# Altium schematic symbol library FPGA_Xilinx_Virtex7.SchLib: 34 symbols (part 7 of 26) (continued)
## XC7VH870T-FLG1932 (continued)
part P pins: AB22 VREFN_0, AB23 VP_0, AC22 VN_0, AC23 VREFP_0, AD22 DXN_0, AD23 DXP_0, AJ26 DONE_0, AK19 INIT_B_0, AL26 PROGRAM_B_0, AM19 M2_0, AM21 M1_0, AM23 M0_0, N20 TMS_0, N22 TCK_0, N26 TDO_0, R20 TDI_0, R26 CCLK_0, V17 VCCO_0, W16 VCCO_0
part Q pins: A3 GND, A4 GND, A7 GND, A38 GND, A41 GND, A42 GND, AA17 VCCINT, AA19 VCCAUX_IO_G2, AA21 VCCINT, AA22 GNDADC, AA23 VCCADC, AA25 VCCAUX_IO_G0, AA27 VCCINT, AA29 VCCINT, AB16 VCCINT, AB18 VCCAUX, AB20 VCCINT, AB24 VCCBRAM, AB26 VCCAUX, AB28 VCCINT, AC17 VCCINT, AC19 VCCAUX_IO_G2, AC21 VCCINT, AC25 VCCAUX_IO_G0, AC27 VCCINT, AC29 VCCINT, AD16 VCCINT, AD18 VCCAUX, AD20 VCCINT, AD24 VCCBRAM, AD26 VCCAUX, AD28 VCCINT, AE17 VCCINT, AE19 VCCINT, AE21 VCCINT, AE23 VCCINT, AE25 VCCINT, AE27 VCCINT, AE29 VCCINT, AF16 VCCINT, AF18 VCCAUX, AF20 VCCINT, AF22 VCCINT, AF24 VCCBRAM, AF26 VCCAUX, AF28 VCCINT, AG17 VCCINT, AG19 VCCINT, AG21 VCCINT, AG23 VCCINT, AG25 VCCINT, AG27 VCCINT, AG29 VCCINT, AH16 VCCINT, AH18 VCCAUX, AH20 VCCINT, AH22 VCCINT, AH24 VCCBRAM, AH26 VCCAUX, AH28 VCCINT, AJ17 VCCINT, AJ19 VCCINT, AJ21 VCCINT, AJ23 VCCINT, AJ25 VCCINT, AJ27 VCCINT, AK18 VCCINT, AK20 VCCINT, AK22 VCCINT, AK24 VCCBRAM, AK26 VCCINT, AL19 VCCINT, AL21 VCCINT, AL23 VCCINT, AL25 VCCINT, AL27 VCCINT, AM18 VCCINT, AM20 VCCINT, AM22 VCCINT, AM24 VCCBRAM, AM26 VCCINT, B2 GND, B5 GND, B7 GND, B38 GND, B40 GND, B43 GND, C4 GND, C7 GND, C38 GND, C41 GND, D1 GND, D6 GND, D7 GND, D38 GND, D39 GND, D44 GND, E3 GND, E4 GND, E7 GND, E8 GND, E9 GND, E10 GND, E11 GND, E12 GND, E13 GND, E14 GND, E15 GND, E16 GND, E17 GND, E19 GND, E22 GND, E23 GND, E26 GND, E27 GND, E28 GND, E29 GND, E30 GND, E31 GND, E32 GND, E33 GND, E34 GND, E35 GND, E36 GND, E37 GND, E38 GND, E41 GND, E42 GND, F1 GND, F2 GND, F6 GND, F9 GND, F17 GND, F19 GND, F21 GND, F23 GND, F25 GND, F27 GND, F28 GND, F36 GND, F39 GND, F43 GND, F44 GND, G4 GND, G7 GND, G8 GND, G9 GND, G14 GND, G17 GND, G19 GND, G22 GND, G23 GND, G24 GND, G25 GND, G28 GND, G34 GND, G36 GND, G37 GND, G38 GND, G41 GND, H1 GND, H6 GND, H9 GND, H11 GND, H17 GND, H18 GND, H19 GND, H20 GND, H21 GND, H23 GND, H24 GND, H25 GND, H27 GND, H28 GND, H31 GND, N19 VCCINT, N21 VCCINT, N23 VCCINT, N25 VCCINT, N27 VCCINT, P20 VCCINT, P22 VCCINT, P24 VCCBRAM, P26 VCCINT, R19 VCCINT, R21 VCCINT, R22 VCCBATT_0, R23 VCCINT, R25 VCCINT, R27 VCCINT, T18 VCCINT, T20 VCCINT, T22 VCCINT, T24 VCCBRAM, T26 VCCINT, T28 VCCINT, U17 VCCINT, U19 VCCINT, U21 VCCINT, U23 VCCINT, U25 VCCINT, U27 VCCINT, U29 VCCINT, V16 VCCINT, V18 VCCAUX, V20 VCCINT, V22 VCCINT, V24 VCCBRAM, V26 VCCAUX, V28 VCCINT, W17 VCCINT, W19 VCCAUX_IO_G2, W21 VCCINT, W23 VCCINT, W25 VCCAUX_IO_G0, W27 VCCINT, W29 VCCINT, Y16 VCCINT, Y18 VCCAUX, Y20 VCCINT, Y22 VCCINT, Y24 VCCBRAM, Y26 VCCAUX, Y28 VCCINT
part R pins: AA3 GND, AA4 GND, AA7 GND, AA11 GND, AA12 GND, AA16 GND, AA18 GND, AA20 GND, AA24 GND, AA26 GND, AA28 GND, AA32 GND, AA34 GND, AA38 GND, AA41 GND, AA42 GND, AB1 GND, AB2 GND, AB5 GND, AB9 GND, AB10 GND, AB11 GND, AB17 GND, AB19 GND, AB21 GND, AB25 GND, AB27 GND, AB29 GND, AB34 GND, AB35 GND, AB36 GND, AB40 GND, AB43 GND, AB44 GND, AC3 GND, AC7 GND, AC8 GND, AC11 GND, AC16 GND, AC18 GND, AC20 GND, AC24 GND, AC26 GND, AC28 GND, AC34 GND, AC37 GND, AC38 GND, AC42 GND, AD1 GND, AD5 GND, AD6 GND, AD9 GND, AD11 GND, AD13 GND, AD17 GND, AD19 GND, AD21 GND, AD25 GND, AD27 GND, AD29 GND, AD33 GND, AD34 GND, AD36 GND, AD39 GND, AD40 GND, AD44 GND, AE3 GND, AE4 GND, AE7 GND, AE11 GND, AE16 GND, AE18 GND, AE20 GND, AE22 GND, AE24 GND, AE26 GND, AE28 GND, AE30 GND, AE34 GND, AE38 GND, AE41 GND, AE42 GND, AF1 GND, AF2 GND, AF5 GND, AF9 GND, AF10 GND, AF11 GND, AF17 GND, AF19 GND, AF21 GND, AF23 GND, AF25 GND, AF27 GND, AF29 GND, AF34 GND, AF35 GND, AF36 GND, AF40 GND, AF43 GND, AF44 GND, AG3 GND, AG7 GND, H36 GND, H39 GND, H44 GND, J3 GND, J4 GND, J7 GND, J9 GND, J17 GND, J18 GND, J20 GND, J24 GND, J26 GND, J28 GND, J36 GND, J38 GND, J41 GND, J42 GND, K1 GND, K2 GND, K5 GND, K9 GND, K10 GND, K11 GND, K15 GND, K17 GND, K18 GND, K21 GND, K22 GND, K23 GND, K24 GND, K25 GND, K26 GND, K27 GND, K28 GND, K34 GND, K35 GND, K36 GND, K40 GND, K43 GND, K44 GND, L3 GND, L7 GND, L8 GND, L11 GND, L12 GND, L18 GND, L19 GND, L21 GND, L23 GND, L25 GND, L27 GND, L32 GND, L34 GND, L37 GND, L38 GND, L42 GND, M1 GND, M5 GND, M6 GND, M9 GND, M10 GND, M11 GND, M19 GND, M20 GND, M21 GND, M22 GND, M23 GND, M24 GND, M25 GND, M26 GND, M27 GND, M29 GND, M34 GND, M35 GND, M36 GND, M39 GND, M40 GND, M44 GND, N3 GND, N4 GND, N7 GND, N11 GND, N16 GND, N24 GND, N34 GND, N38 GND, N41 GND, N42 GND, P1 GND, P2 GND, P5 GND, P9 GND, P10 GND, P11 GND, P13 GND, P19 GND, P21 GND, P23 GND, P25 GND, P27 GND, P33 GND, P34 GND, P35 GND, P36 GND, P40 GND, P43 GND, P44 GND, R3 GND, R7 GND, R8 GND, R11 GND, R18 GND, R24 GND, R30 GND, R34 GND, R37 GND, R38 GND, R42 GND, T1 GND, T5 GND, T6 GND, T9 GND, T11 GND, T17 GND, T19 GND, T21 GND, T23 GND, T25 GND, T27 GND, T34 GND, T36 GND, T39 GND, T40 GND, T44 GND, U3 GND, U7 GND, U11 GND, U14 GND, U16 GND, U18 GND, U20 GND, U22 GND, U24 GND, U26 GND, U28 GND, U34 GND, U38 GND, U42 GND, V1 GND, V5 GND, V9 GND, V10 GND, V11 GND, V19 GND, V21 GND, V23 GND, V25 GND, V27 GND, V29 GND, V31 GND, V34 GND, V35 GND, V36 GND, V40 GND, V44 GND, W3 GND, W7 GND, W8 GND, W11 GND, W18 GND, W20 GND, W22 GND, W24 GND, W26 GND, W28 GND, W34 GND, W37 GND, W38 GND, W42 GND, Y1 GND, Y5 GND, Y6 GND, Y9 GND, Y10 GND, Y11 GND, Y15 GND, Y17 GND, Y19 GND, Y21 GND, Y23 GND, Y25 GND, Y27 GND, Y29 GND, Y34 GND, Y35 GND, Y36 GND, Y39 GND, Y40 GND, Y44 GND
part S pins: AG11 GND, AG14 GND, AG16 GND, AG18 GND, AG20 GND, AG22 GND, AG24 GND, AG26 GND, AG28 GND, AG34 GND, AG38 GND, AG42 GND, AH1 GND, AH5 GND, AH9 GND, AH10 GND, AH11 GND, AH17 GND, AH19 GND, AH21 GND, AH23 GND, AH25 GND, AH27 GND, AH29 GND, AH31 GND, AH34 GND, AH35 GND, AH36 GND, AH40 GND, AH44 GND, AJ3 GND, AJ4 GND, AJ7 GND, AJ11 GND, AJ16 GND, AJ18 GND, AJ20 GND, AJ22 GND, AJ24 GND, AJ28 GND, AJ34 GND, AJ38 GND, AJ41 GND, AJ42 GND, AK1 GND, AK5 GND, AK9 GND, AK11 GND, AK15 GND, AK17 GND, AK21 GND, AK23 GND, AK25 GND, AK27 GND, AK34 GND, AK36 GND, AK40 GND, AK44 GND, AL3 GND, AL7 GND, AL8 GND, AL11 GND, AL12 GND, AL18 GND, AL20 GND, AL22 GND, AL24 GND, AL32 GND, AL34 GND, AL37 GND, AL38 GND, AL42 GND, AM1 GND, AM5 GND, AM6 GND, AM9 GND, AM10 GND, AM11 GND, AM25 GND, AM27 GND, AM29 GND, AM34 GND, AM35 GND, AM36 GND, AM39 GND, AM40 GND, AM44 GND, AN3 GND, AN4 GND, AN8 GND, AN11 GND, AN16 GND, AN18 GND, AN19 GND, AN20 GND, AN21 GND, AN22 GND, AN23 GND, AN24 GND, AN25 GND, AN26 GND, AN27 GND, AN34 GND, AN37 GND, AN41 GND, AN42 GND, AP1 GND, AP2 GND, AP5 GND, AP6 GND, AP9 GND, AP10 GND, AP11 GND, AP13 GND, AP18 GND, AP20 GND, AP22 GND, AP24 GND, AP26 GND, AP27 GND, AP33 GND, AP34 GND, AP35 GND, AP36 GND, AP39 GND, AP40 GND, AP43 GND, AP44 GND, AR4 GND, AR7 GND, AR9 GND, AR10 GND, AR17 GND, AR18 GND, AR19 GND, AR20 GND, AR21 GND, AR22 GND, AR23 GND, AR24 GND, AR27 GND, AR28 GND, AR30 GND, AR36 GND, AR38 GND, AR41 GND, AT1 GND, AT6 GND, AT9 GND, AT17 GND, AT19 GND, AT21 GND, AT25 GND, AT27 GND, AT28 GND, AT36 GND, AT39 GND, AT44 GND, AU3 GND, AU4 GND, AU7 GND, AU8 GND, AU9 GND, AU14 GND, AU17 GND, AU18 GND, AU20 GND, AU21 GND, AU22 GND, AU24 GND, AU25 GND, AU26 GND, AU27 GND, AU28 GND, AU34 GND, AU36 GND, AU37 GND, AU38 GND, AU41 GND, AU42 GND, AV1 GND, AV2 GND, AV6 GND, AV9 GND, AV11 GND, AV17 GND, AV20 GND, AV21 GND, AV22 GND, AV23 GND, AV26 GND, AV28 GND, AV31 GND, AV36 GND, AV39 GND, AV43 GND, AV44 GND, AW4 GND, AW7 GND, AW8 GND, AW9 GND, AW17 GND, AW18 GND, AW20 GND, AW22 GND, AW24 GND, AW26 GND, AW28 GND, AW36 GND, AW37 GND, AW38 GND, AW41 GND, AY1 GND, AY6 GND, AY7 GND, AY8 GND, AY9 GND, AY10 GND, AY11 GND, AY12 GND, AY13 GND, AY14 GND, AY15 GND, AY16 GND, AY17 GND, AY18 GND, AY19 GND, AY22 GND, AY23 GND, AY26 GND, AY28 GND, AY29 GND, AY30 GND, AY31 GND, AY32 GND, AY33 GND, AY34 GND, AY35 GND, AY36 GND, AY37 GND, AY38 GND, AY39 GND, AY44 GND, BA3 GND, BA4 GND, BA7 GND, BA38 GND, BA41 GND, BA42 GND, BB1 GND, BB2 GND, BB5 GND, BB7 GND, BB38 GND, BB40 GND, BB43 GND, BB44 GND, BC2 GND, BC4 GND, BC7 GND, BC38 GND, BC41 GND, BC43 GND, BD5 GND, BD6 GND, BD7 GND, BD38 GND, BD39 GND, BD40 GND

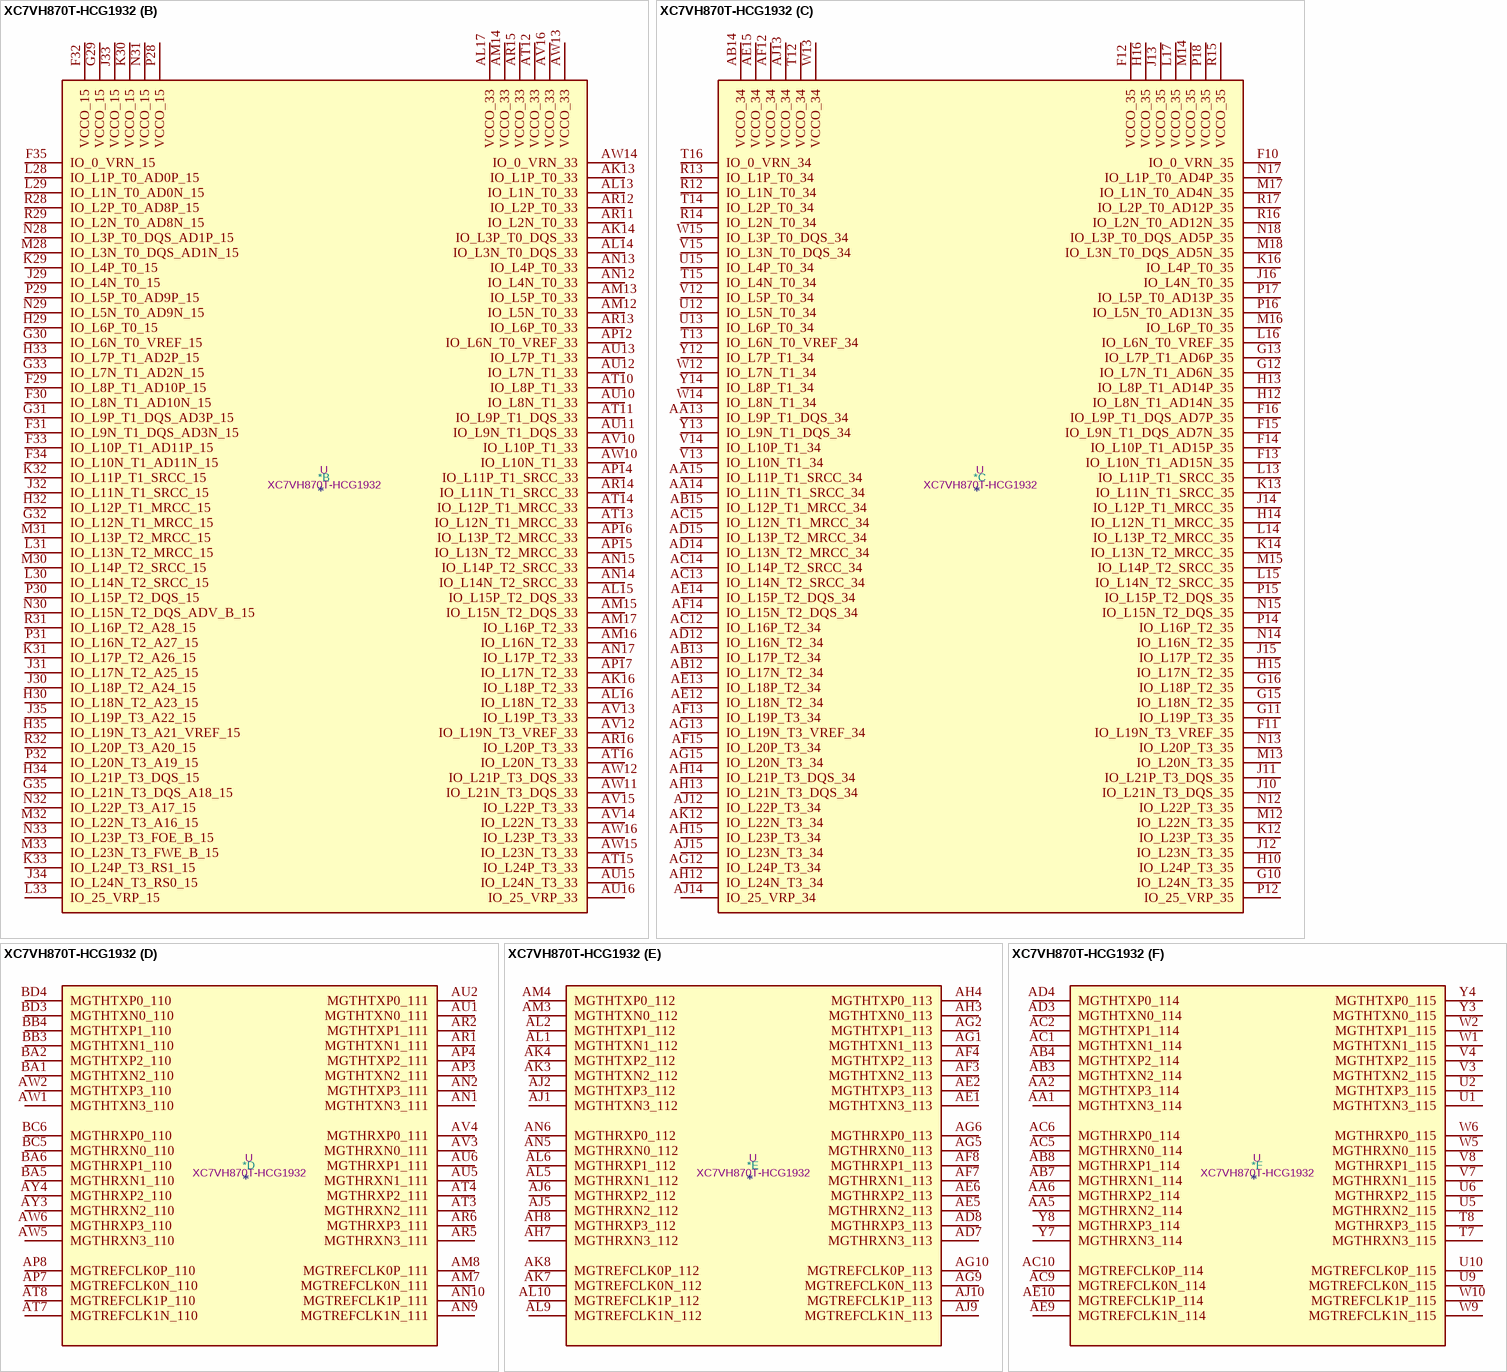
[diagram p47: symbol XC7VH870T-HCG1932]

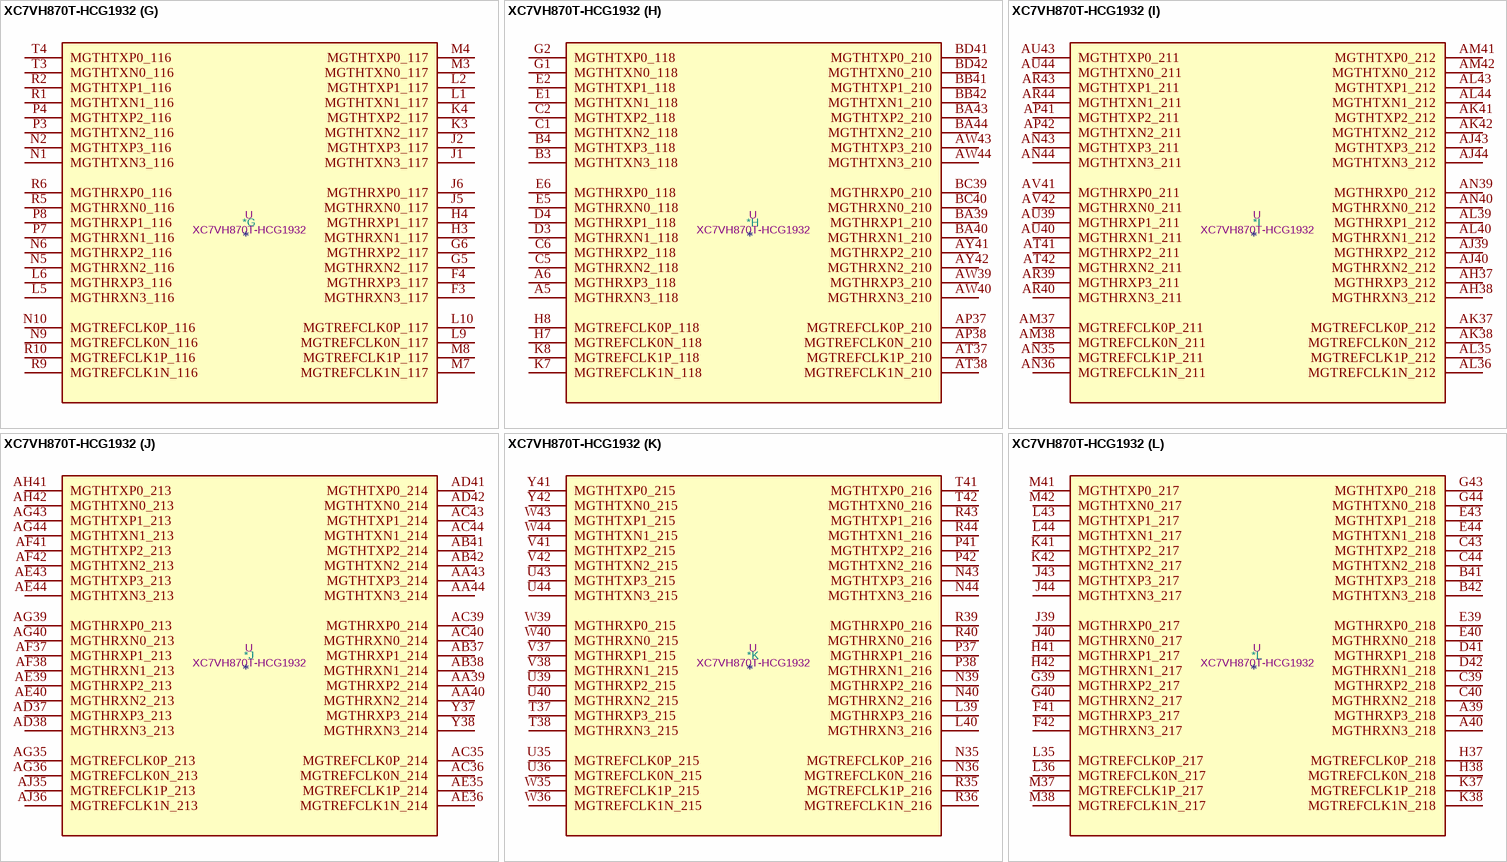
[diagram p48: symbol XC7VH870T-HCG1932]

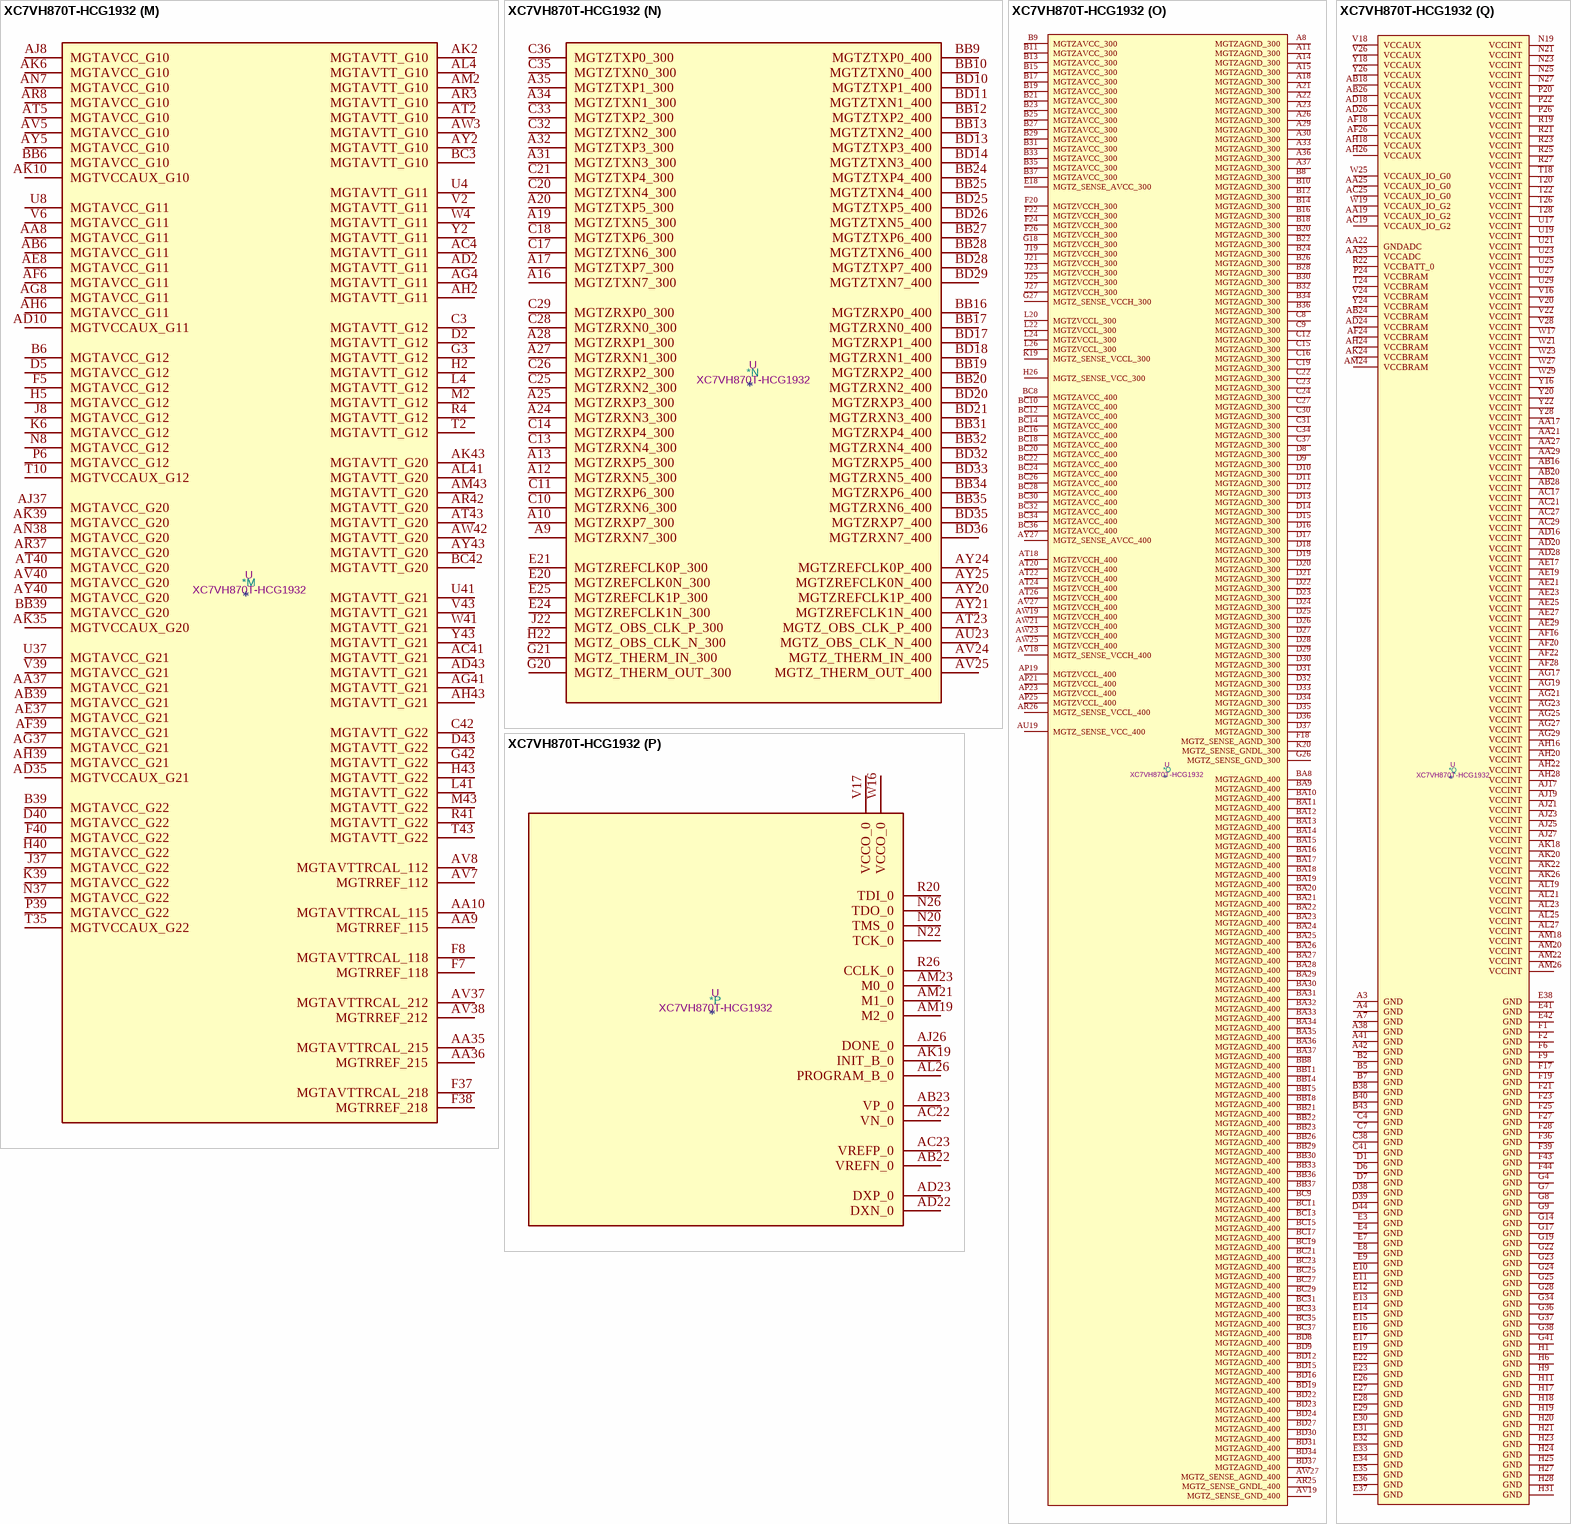
[diagram p49: symbol XC7VH870T-HCG1932]

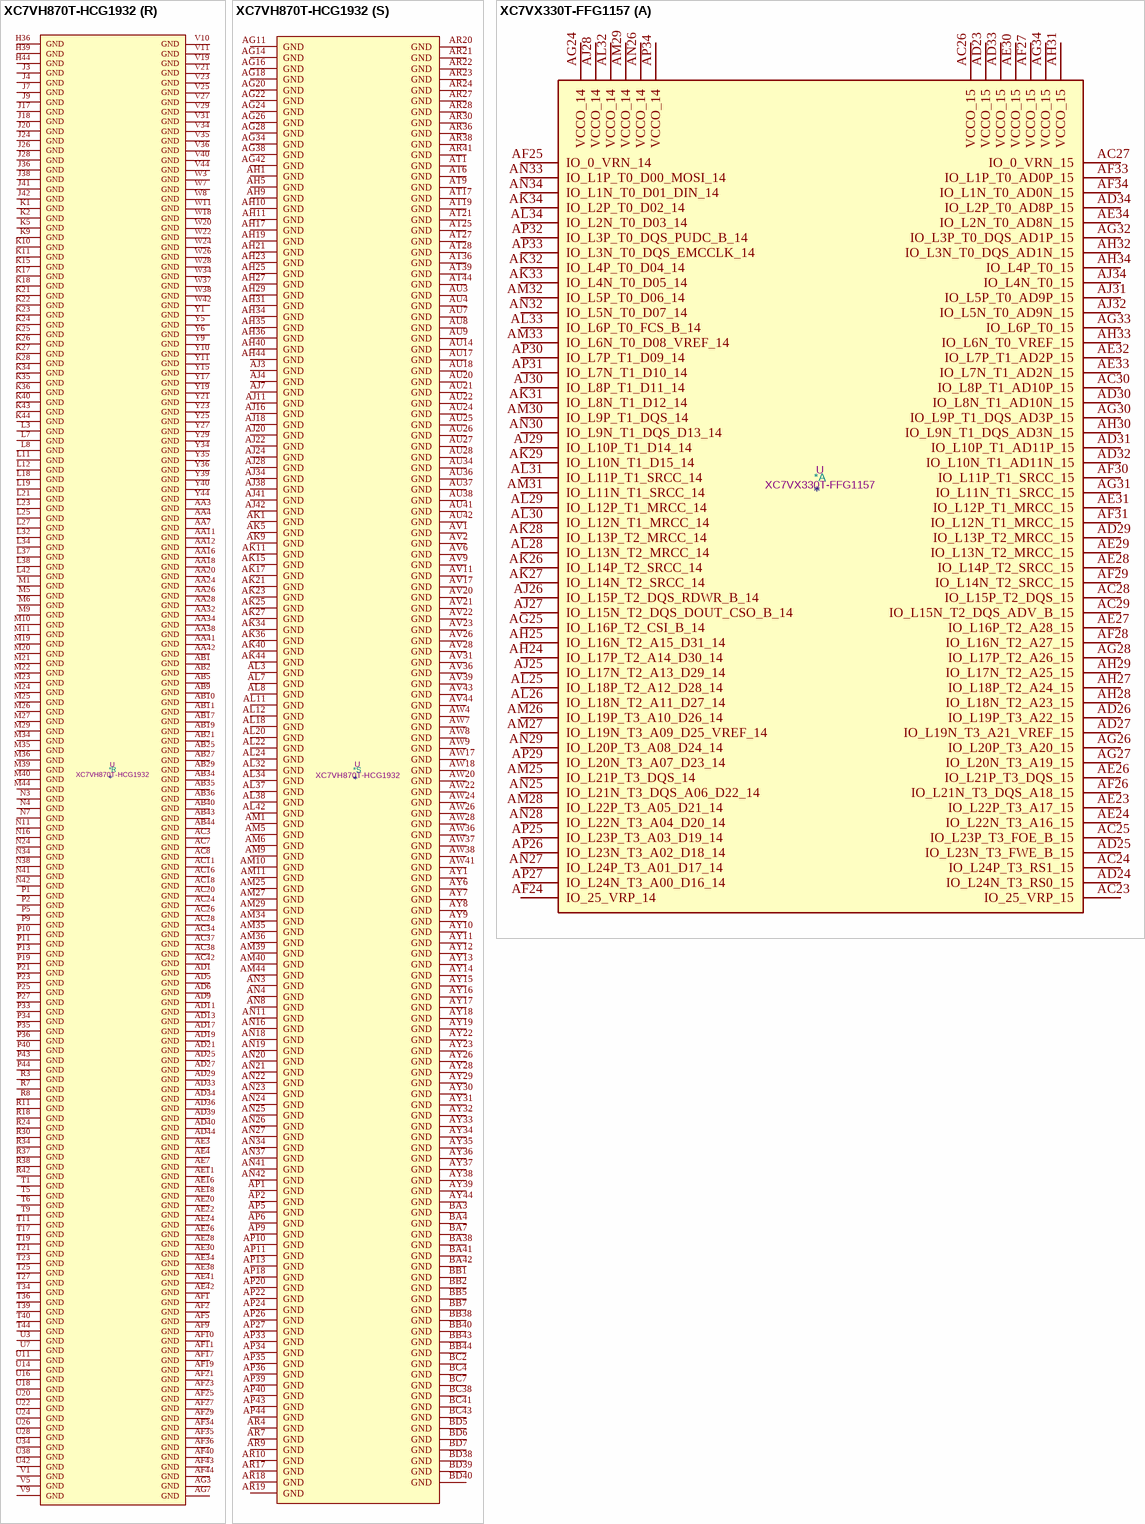
[diagram p50: symbols XC7VH870T-HCG1932 to XC7VX330T-FFG1157]